# Altium footprint library Zmod.PcbLib: 229 footprints (part 11 of 15)
Each footprint in its own frame and in the unit in brackets; x right, y up, seen from the top. Pads: shape width x height; smd on the part's side, far side on the other; paste and mask are expansions set on the pad; w line width, h text height; cw(c..) or ccw(c..) is an arc to the next point about the centre after c.
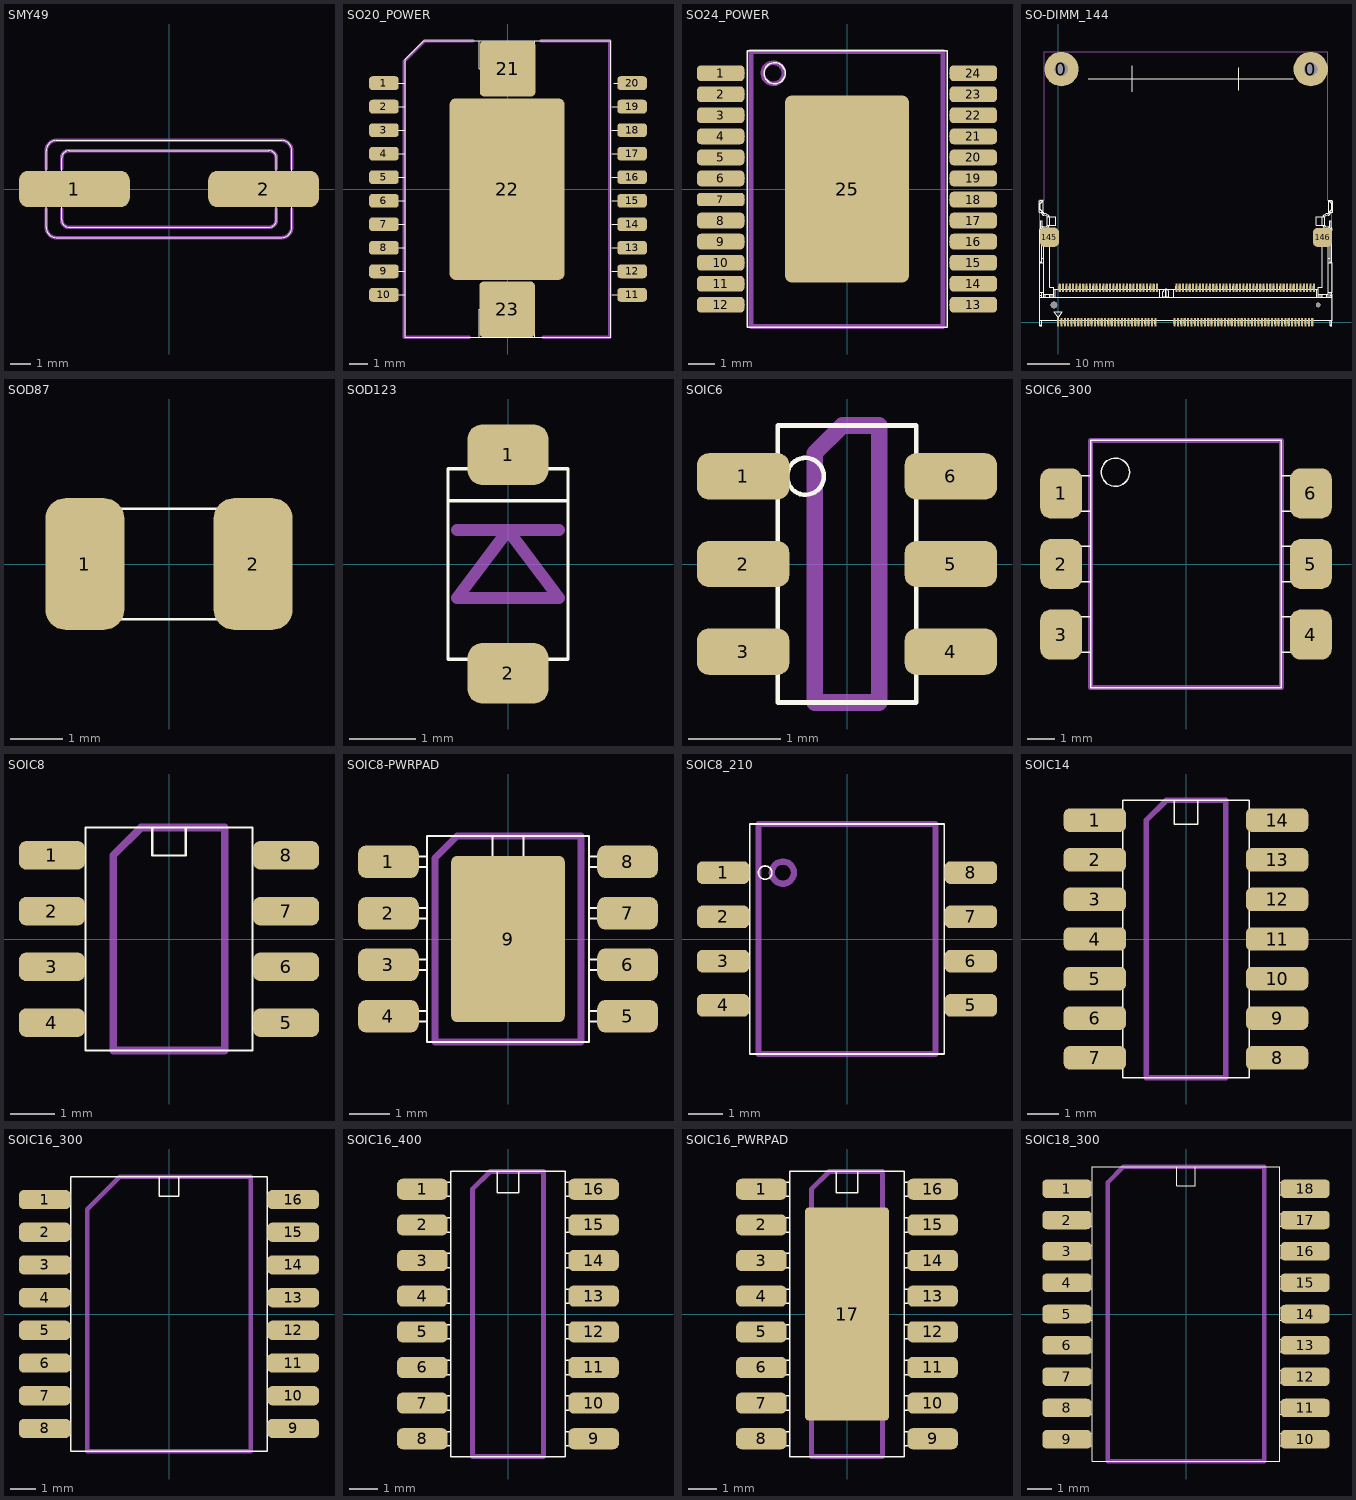
[diagram p10: the footprints below, top view; thin cyan lines are the x and y axes]

## SMY49 [mm]
height 5.08
pads (2):
  rrect50% 5.5x1.8 smd: 1(-4.699,0) 2(4.699,0)
Top Overlay:
  lines w0.05: -6.096,-0.508 -6.731,-0.508 -6.731,0.508 -6.096,0.508 ; 6.096,-0.508 6.731,-0.508 6.731,0.508 6.096,0.508 ; -6.096,-1.905 ccw(c-5.588,-1.905) -5.588,-2.413 5.588,-2.413 ccw(c5.588,-1.905) 6.096,-1.905 6.096,1.905 ccw(c5.588,1.905) 5.588,2.413 -5.588,2.413 ccw(c-5.588,1.905) -6.096,1.905 -6.096,-1.905 ; -5.334,-1.524 ccw(c-4.953,-1.524) -4.953,-1.905 4.953,-1.905 ccw(c4.953,-1.524) 5.334,-1.524 5.334,1.524 ccw(c4.953,1.524) 4.953,1.905 -4.953,1.905 ccw(c-4.953,1.524) -5.334,1.524 -5.334,-1.524
Mechanical 15:
  lines w0.18: -6.096,-1.016 -6.096,-1.905 ccw(c-5.588,-1.905) -5.588,-2.413 5.588,-2.413 ccw(c5.588,-1.905) 6.096,-1.905 6.096,-1.016 ; -6.096,1.016 -6.096,1.905 cw(c-5.588,1.905) -5.588,2.413 5.588,2.413 cw(c5.588,1.905) 6.096,1.905 6.096,1.016 ; -5.334,-1.016 -5.334,-1.524 ccw(c-4.953,-1.524) -4.953,-1.905 4.953,-1.905 ccw(c4.953,-1.524) 5.334,-1.524 5.334,-1.016 ; -5.334,1.016 -5.334,1.524 cw(c-4.953,1.524) -4.953,1.905 4.953,1.905 cw(c4.953,1.524) 5.334,1.524 5.334,1.016
  text ".Designator" at -6.223,2.667 h1.5

## SO20_POWER [mm] "ST Micro Jedec MO-166 Rev. 1"
height 3.6
pads (23):
  rrect50% 1.6x0.75 smd: 1(-6.7,5.715) 2(-6.7,4.445) 3(-6.7,3.175) 4(-6.7,1.905) 5(-6.7,0.635) 6(-6.7,-0.635) 7(-6.7,-1.905) 8(-6.7,-3.175) 9(-6.7,-4.445) 10(-6.7,-5.715) 11(6.7,-5.715) 12(6.7,-4.445) 13(6.7,-3.175) 14(6.7,-1.905) 15(6.7,-0.635) 16(6.7,0.635) 17(6.7,1.905) 18(6.7,3.175) 19(6.7,4.445) 20(6.7,5.715)
  rrect15% 3x3 smd: 21(-0.025,6.5) 23(-0.05,-6.5)
  rrect10% 6.2x9.8 smd: 22(-0.05,-0.01)
Top Overlay:
  lines w0.05: -6.7,1.905 -6.695,1.9 ; -6.6,-5.715 -5.6,-5.715 ; -6.6,-4.445 -5.6,-4.445 ; -6.6,-3.175 -5.6,-3.175 ; -6.6,-1.905 -5.6,-1.905 ; -6.6,-0.635 -5.6,-0.635 ; -6.6,0.635 -5.6,0.635 ; -6.6,3.175 -5.6,3.175 ; -6.6,4.445 -5.6,4.445 ; -6.6,5.715 -5.6,5.715 ; -6.345,1.9 -5.855,1.9 ; -5.955,1.9 -5.95,1.905 ; -5.85,1.905 -5.6,1.905 ; 5.6,-5.715 6.6,-5.715 ; 5.6,-4.445 6.6,-4.445 ; 5.6,-3.175 6.6,-3.175 ; 5.6,-1.905 6.6,-1.905 ; 5.6,-0.635 6.6,-0.635 ; 5.6,0.635 6.6,0.635 ; 5.6,1.905 6.6,1.905 ; 5.6,3.175 6.6,3.175 ; 5.6,4.445 6.6,4.445 ; 5.7,5.715 6.7,5.715 ; -1.55,-8 -1.55,-6.5 1.45,-6.5 1.45,-8 ; -1.55,-8 -5.55,-8 -5.55,7 -4.55,8 -1.55,8 ; -1.55,-8 1.45,-8 ; -1.55,8 -1.55,6.5 1.45,6.5 1.45,8 ; -1.55,8 1.45,8 ; 1.45,-8 5.55,-8 5.55,8 1.45,8
Top Solder:
  rectangle: -3.2,-5 3.1,5
  rectangle: -1.7,-8.1 1.6,-4.9
  rectangle: -1.6,4.9 1.6,8.1
Mechanical 15:
  lines w0.18: -2.1,-8 -5.6,-8 -5.6,-6.4 -5.6,6.9 -5.5,7 -4.5,8 -1.9,8 ; 1.8,8 5.5,8 5.5,-8 1.9,-8
  text ".Designator" at -6.8,-0.3 h1.5

## SO24_POWER [mm] "ST Micro, Rev. 1"
height 2.47
pads (25):
  rrect50% 1.8x0.6 smd mask+0.065: 1(-4.8,4.4) 2(-4.8,3.6) 3(-4.8,2.8) 4(-4.8,2) 5(-4.8,1.2) 6(-4.8,0.4) 8(-4.8,-1.2) 9(-4.8,-2) 10(-4.8,-2.8) 11(-4.8,-3.6) 12(-4.8,-4.4) 13(4.8,-4.4) 14(4.8,-3.6) 15(4.8,-2.8) 16(4.8,-2) 17(4.8,-1.2) 18(4.8,-0.4) 19(4.8,0.4) 20(4.8,1.2) 21(4.8,2) 22(4.8,2.8) 23(4.8,3.6) 24(4.8,4.4)
  rrect50% 1.8x0.51 smd mask+0.065: 7(-4.8,-0.4)
  rrect10% 4.7x7.1 smd mask+0.065: 25(0,0)
Top Overlay:
  circle w0.05: c-2.75,4.4 r0.4
  lines w0.05: -4.45,-4.4 -3.9,-4.4 ; -4.45,-3.6 -3.9,-3.6 ; -4.45,-2.8 -3.9,-2.8 ; -4.45,-2 -3.9,-2 ; -4.45,-1.2 -3.9,-1.2 ; -4.45,-0.4 -3.9,-0.4 ; -4.45,0.4 -3.9,0.4 ; -4.45,1.2 -3.9,1.2 ; -4.45,2 -3.9,2 ; -4.45,2.8 -3.9,2.8 ; -4.45,3.6 -3.9,3.6 ; -4.45,4.4 -3.9,4.4 ; 3.9,-4.4 4.45,-4.4 ; 3.9,-3.6 4.45,-3.6 ; 3.9,-2.8 4.45,-2.8 ; 3.9,-2 4.45,-2 ; 3.9,-1.2 4.45,-1.2 ; 3.9,-0.4 4.45,-0.4 ; 3.9,0.4 4.45,0.4 ; 3.9,1.2 4.45,1.2 ; 3.9,2 4.45,2 ; 3.9,2.8 4.45,2.8 ; 3.9,3.6 4.45,3.6 ; 3.9,4.4 4.45,4.4 ; -3.8,-5.25 3.8,-5.25 3.8,5.25 -3.8,5.25 -3.8,-5.25
Mechanical 15:
  circle w0.18: c-2.8,4.4 r0.4
  lines w0.18: -3.675,5.225 3.65,5.225 3.65,-5.225 -3.65,-5.225 -3.65,5.225
  text ".Designator" at -3.4,-0.425 h1.5

## SO-DIMM_144 [mm]
height 5.6
pads (150):
  round 1.6 hole 1.6: 0(-1,4.1)
  round 8.2 hole 3.2: 0(0.8,60.35) 0(60.25,60.35)
  round 1.1 hole 1.1: 0(62,4.1)
  rrect50% 0.5x2 smd: 1(0,0) 2(0.4,8.2) 3(0.8,0) 4(1.2,8.2) 5(1.6,0) 6(2,8.2) 7(2.4,0) 8(2.8,8.2) 9(3.2,0) 10(3.6,8.2) 11(4,0) 12(4.4,8.2) 13(4.8,0) 14(5.2,8.2) 15(5.6,0) 16(6,8.2) 17(6.4,0) 18(6.8,8.2) 19(7.2,0) 20(7.6,8.2) 21(8,0) 22(8.4,8.2) 23(8.8,0) 24(9.2,8.2) 25(9.6,0) 26(10,8.2) 27(10.4,0) 28(10.8,8.2) 29(11.2,0) 30(11.6,8.2) 31(12,0) 32(12.4,8.2) 33(12.8,0) 34(13.2,8.2) 35(13.6,0) 36(14,8.2) 37(14.4,0) 38(14.8,8.2) 39(15.2,0) 40(15.6,8.2) 41(16,0) 42(16.4,8.2) 43(16.8,0) 44(17.2,8.2) 45(17.6,0) 46(18,8.2) 47(18.4,0) 48(18.8,8.2) 49(19.2,0) 50(19.6,8.2) 51(20,0) 52(20.4,8.2) 53(20.8,0) 54(21.2,8.2) 55(21.6,0) 56(22,8.2) 57(22.4,0) 58(22.8,8.2) 59(23.2,0) 60(23.6,8.2) 61(27.8,0) 62(28.2,8.2) 63(28.6,0) 64(29,8.2) 65(29.4,0) 66(29.8,8.2) 67(30.2,0) 68(30.6,8.2) 69(31,0) 70(31.4,8.2) 71(31.8,0) 72(32.2,8.2) 73(32.6,0) 74(33,8.2) 75(33.4,0) 76(33.8,8.2) 77(34.2,0) 78(34.6,8.2) 79(35,0) 80(35.4,8.2) 81(35.8,0) 82(36.2,8.2) 83(36.6,0) 84(37,8.2) 85(37.4,0) 86(37.8,8.2) 87(38.2,0) 88(38.6,8.2) 89(39,0) 90(39.4,8.2) 91(39.8,0) 92(40.2,8.2) 93(40.6,0) 94(41,8.2) 95(41.4,0) 96(41.8,8.2) 97(42.2,0) 98(42.6,8.2) 99(43,0) 100(43.4,8.2) 101(43.8,0) 102(44.2,8.2) 103(44.6,0) 104(45,8.2) 105(45.4,0) 106(45.8,8.2) 107(46.2,0) 108(46.6,8.2) 109(47,0) 110(47.4,8.2) 111(47.8,0) 112(48.2,8.2) 113(48.6,0) 114(49,8.2) 115(49.4,0) 116(49.8,8.2) 117(50.2,0) 118(50.6,8.2) 119(51,0) 120(51.4,8.2) 121(51.8,0) 122(52.2,8.2) 123(52.6,0) 124(53,8.2) 125(53.4,0) 126(53.8,8.2) 127(54.2,0) 128(54.6,8.2) 129(55,0) 130(55.4,8.2) 131(55.8,0) 132(56.2,8.2) 133(56.6,0) 134(57,8.2) 135(57.4,0) 136(57.8,8.2) 137(58.2,0) 138(58.6,8.2) 139(59,0) 140(59.4,8.2) 141(59.8,0) 142(60.2,8.2) 143(60.6,0) 144(61,8.2)
  rrect50% 4.5x4.6 smd: 145(-2.05,20.25) 146(63.05,20.2)
Top Overlay:
  drawing of 3786 lines, arcs and shapes, not listed
Mechanical 15:
  lines w0.18: -0.4,0.4 -3.95,0.4 -3.95,-0.8 -4.35,-0.8 -4.35,29.15 -3.3,29.15 -3.3,64.5 -1,64.5 64.3,64.5 64.3,55.9 64.3,29.05 65.3,29.05 65.3,-0.8 64.9,-0.8 64.9,0.4 61.05,0.4
  text ".Designator" at 22.05,32.8 h1.5

## SOD87 [mm]
height 2.1
pads (2):
  rrect50% 1.5x2.5 smd: 1(-1.6,0) 2(1.6,0)
Top Overlay:
  lines w0.05: -1.4,-1.05 -1.4,1.05 ; -1.85,-1.05 1.85,-1.05 1.85,1.05 -1.85,1.05 -1.85,-1.05
  text ".Designator" at -1.4,-0.7 h1.5

## SOD123 [mm] "SOD123"
height 1.2
pads (2):
  rrect50% 1.22x0.91 smd: 1(0,1.64) 2(0,-1.64)
Top Overlay:
  lines w0.05: -0.878,0.95 0.9,0.95 ; -0.35,-1.43 -0.35,-1.95 0.35,-1.95 0.35,-1.43 ; -0.35,1.43 -0.35,1.95 0.35,1.95 0.35,1.43 ; -0.9,-1.43 -0.9,1.43 0.9,1.43 0.9,-1.43 -0.9,-1.43
Mechanical 15:
  lines w0.18: -0.762,0.508 0.762,0.508 ; -0.762,-0.508 0,0.508 0.762,-0.508 -0.762,-0.508
  text ".Designator" at 0.65,-2.46 h1.5

## SOIC6 [mm]
height 1.5
pads (6):
  rrect50% 1x0.5 smd paste+0: 1(-1.125,0.95) 2(-1.125,0) 3(-1.125,-0.95) 4(1.125,-0.95) 5(1.125,0) 6(1.125,0.95)
Top Overlay:
  circle w0.05: c-0.45,0.95 r0.2
  lines w0.05: -0.76,-1.1 -1.4,-1.1 -1.4,-0.8 -0.75,-0.8 ; -0.75,-0.15 -1.4,-0.15 -1.4,0.15 -0.75,0.15 ; -0.75,0.8 -1.4,0.8 -1.4,1.1 -0.75,1.1 ; 0.75,-1.1 1.4,-1.1 1.4,-0.8 0.75,-0.8 ; 0.75,-0.15 1.4,-0.15 1.4,0.15 0.75,0.15 ; 0.75,0.8 1.4,0.8 1.4,1.1 0.75,1.1 ; -0.75,-1.5 0.75,-1.5 0.75,1.5 -0.75,1.5 -0.75,-1.5
Mechanical 15:
  lines w0.18: -0.35,-1.5 0.35,-1.5 0.35,1.5 -0.05,1.5 -0.35,1.2 -0.35,-1.5
  text ".Designator" at 0,-1.627 h1.5

## SOIC6_300 [mm]
height 5
pads (6):
  rrect50% 1.5x1.8 smd paste+0: 1(-4.496,2.54) 2(-4.496,0) 3(-4.496,-2.54) 4(4.496,-2.54) 5(4.496,0) 6(4.496,2.54)
Top Overlay:
  circle w0.05: c-2.54,3.302 r0.508
  lines w0.05: -3.429,-3.175 -3.81,-3.175 -4.318,-2.794 -4.953,-2.794 -4.953,-2.286 -4.318,-2.286 -3.81,-1.905 -3.429,-1.905 ; -3.429,-0.635 -3.81,-0.635 -4.318,-0.254 -4.953,-0.254 -4.953,0.254 -4.318,0.254 -3.81,0.635 -3.429,0.635 ; -3.429,1.905 -3.81,1.905 -4.318,2.286 -4.953,2.286 -4.953,2.794 -4.318,2.794 -3.81,3.175 -3.429,3.175 ; 3.429,-3.175 3.81,-3.175 4.318,-2.794 4.953,-2.794 4.953,-2.286 4.318,-2.286 3.81,-1.905 3.429,-1.905 ; 3.429,-0.635 3.81,-0.635 4.318,-0.254 4.953,-0.254 4.953,0.254 4.318,0.254 3.81,0.635 3.429,0.635 ; 3.429,1.905 3.81,1.905 4.318,2.286 4.953,2.286 4.953,2.794 4.318,2.794 3.81,3.175 3.429,3.175 ; -3.429,-4.445 3.429,-4.445 3.429,4.445 -3.429,4.445 -3.429,-4.445
Mechanical 15:
  lines w0.18: -3.429,-4.445 3.429,-4.445 3.429,4.445 -3.429,4.445 -3.429,-4.445
  text ".Designator" at -1.27,-3.81 h1.5

## SOIC8 [mm]
height 1.1
pads (8):
  rrect50% 1.5x0.65 smd: 1(-2.667,1.905) 2(-2.667,0.635) 3(-2.667,-0.635) 4(-2.667,-1.905) 5(2.667,-1.905) 6(2.667,-0.635) 7(2.667,0.635) 8(2.667,1.905)
Top Overlay:
  lines w0.05: -1.905,-2.032 -2.667,-2.032 -2.667,-1.778 -1.905,-1.778 ; -1.905,-0.762 -2.667,-0.762 -2.667,-0.508 -1.905,-0.508 ; -1.905,0.508 -2.667,0.508 -2.667,0.762 -1.905,0.762 ; -1.905,1.778 -2.667,1.778 -2.667,2.032 -1.905,2.032 ; -0.381,2.54 -0.381,1.905 0.381,1.905 0.381,2.54 ; 1.905,-2.032 2.667,-2.032 2.667,-1.778 1.905,-1.778 ; 1.905,-0.762 2.667,-0.762 2.667,-0.508 1.905,-0.508 ; 1.905,0.508 2.667,0.508 2.667,0.762 1.905,0.762 ; 1.905,1.778 2.667,1.778 2.667,2.032 1.905,2.032 ; -1.905,-2.54 1.905,-2.54 1.905,2.54 -1.27,2.54 -1.905,2.54 -1.905,-2.54
Mechanical 15:
  lines w0.18: -1.27,-2.54 1.27,-2.54 1.27,2.54 -0.635,2.54 -1.27,1.905 -1.27,-2.54
  text ".Designator" at 0.2,-2.4 h1.5

## SOIC8-PWRPAD [mm] "SOIC WITH POWER PAD"
height 1.1
pads (9):
  rrect50% 1.5x0.8 smd: 1(-2.95,1.905) 2(-2.95,0.635) 3(-2.95,-0.635) 4(-2.95,-1.905) 5(2.95,-1.905) 6(2.95,-0.635) 7(2.95,0.635) 8(2.95,1.905)
  rrect10% 2.8x4.1 smd: 9(0,0)
Top Overlay:
  lines w0.05: -2.013,-2.032 -3,-2.032 -3,-1.778 -2.003,-1.778 ; -2.005,2.032 -2,2.037 ; -2.002,1.778 -2,1.776 ; -2,-0.762 -3,-0.762 -3,-0.508 -2,-0.508 ; -2,0.508 -3,0.508 -3,0.762 -2,0.762 ; -2,1.778 -3,1.778 -3,2.032 -2,2.032 ; -0.381,2.54 -0.381,1.905 0.381,1.905 0.381,2.54 ; 2,-2.032 3,-2.032 3,-1.778 2,-1.778 ; 2,-0.762 3,-0.762 3,-0.508 2,-0.508 ; 2,0.508 3,0.508 3,0.762 2,0.762 ; 2,1.774 2.004,1.778 3,1.778 3,2.032 2,2.032 ; -2,-2.54 2,-2.54 2,2.54 -1.27,2.54 -2,2.54 -2,-2.54
Mechanical 15:
  lines w0.18: -1.8,-2.54 1.8,-2.54 1.8,2.54 -1.26,2.54 -1.8,2 -1.8,-2.54
  text ".Designator" at 0.6,-2.2 h1.5

## SOIC8_210 [mm]
height 1.905
pads (8):
  rrect50% 1.5x0.65 smd paste+0: 1(-3.556,1.905) 2(-3.556,0.635) 3(-3.556,-0.635) 4(-3.556,-1.905) 5(3.556,-1.905) 6(3.556,-0.635) 7(3.556,0.635) 8(3.556,1.905)
Top Overlay:
  lines w0.05: -2.794,-2.032 -3.81,-2.032 -3.81,-1.778 -2.794,-1.778 ; -2.794,-0.762 -3.81,-0.762 -3.81,-0.508 -2.794,-0.508 ; -2.794,0.508 -3.81,0.508 -3.81,0.762 -2.794,0.762 ; -2.794,1.778 -3.81,1.778 -3.81,2.032 -2.794,2.032 ; 2.794,-2.032 3.81,-2.032 3.81,-1.778 2.794,-1.778 ; 2.794,-0.762 3.81,-0.762 3.81,-0.508 2.794,-0.508 ; 2.794,0.508 3.81,0.508 3.81,0.762 2.794,0.762 ; 2.794,1.778 3.81,1.778 3.81,2.032 2.794,2.032 ; -2.794,-3.302 2.794,-3.302 2.794,3.302 -2.794,3.302 -2.794,-3.302 ; -2.54,1.905 ccw(c-2.349,1.905) -2.159,1.905 ccw(c-2.349,1.905) -2.54,1.905
Mechanical 15:
  lines w0.18: -2.54,-3.302 2.54,-3.302 2.54,3.302 -2.54,3.302 -2.54,-3.302 ; -2.159,1.905 ccw(c-1.841,1.905) -1.524,1.905 ccw(c-1.841,1.905) -2.159,1.905
  text ".Designator" at -0.889,-3.048 h1.5

## SOIC14 [mm]
height 1.905
pads (14):
  rrect50% 2x0.75 smd paste+0: 1(-2.921,3.81) 2(-2.921,2.54) 3(-2.921,1.27) 4(-2.921,0) 5(-2.921,-1.27) 6(-2.921,-2.54) 7(-2.921,-3.81) 8(2.921,-3.81) 9(2.921,-2.54) 10(2.921,-1.27) 11(2.921,0) 12(2.921,1.27) 13(2.921,2.54) 14(2.921,3.81)
Top Overlay:
  lines w0.05: -2.032,-4.064 -3.175,-4.064 -3.175,-3.556 -2.032,-3.556 ; -2.032,-2.794 -3.175,-2.794 -3.175,-2.286 -2.032,-2.286 ; -2.032,-1.524 -3.175,-1.524 -3.175,-1.016 -2.032,-1.016 ; -2.032,-0.254 -3.175,-0.254 -3.175,0.254 -2.032,0.254 ; -2.032,1.016 -3.175,1.016 -3.175,1.524 -2.032,1.524 ; -2.032,2.286 -3.175,2.286 -3.175,2.794 -2.032,2.794 ; -2.032,3.556 -3.175,3.556 -3.175,4.064 -2.032,4.064 ; -0.381,4.445 -0.381,3.683 0.381,3.683 0.381,4.445 ; 2.032,-4.064 3.175,-4.064 3.175,-3.556 2.032,-3.556 ; 2.032,-2.794 3.175,-2.794 3.175,-2.286 2.032,-2.286 ; 2.032,-1.524 3.175,-1.524 3.175,-1.016 2.032,-1.016 ; 2.032,-0.254 3.175,-0.254 3.175,0.254 2.032,0.254 ; 2.032,1.016 3.175,1.016 3.175,1.524 2.032,1.524 ; 2.032,2.286 3.175,2.286 3.175,2.794 2.032,2.794 ; 2.032,3.556 3.175,3.556 3.175,4.064 2.032,4.064 ; -2.032,-4.445 2.032,-4.445 2.032,4.445 -2.032,4.445 -2.032,-4.445
Mechanical 15:
  lines w0.18: -1.27,-4.445 -1.27,3.81 -0.635,4.445 1.27,4.445 1.27,-4.445 -1.27,-4.445
  text ".Designator" at -0.762,-4.064 h1.5

## SOIC16_300 [mm]
height 1.905
pads (16):
  rrect50% 2x0.75 smd paste+0: 1(-4.826,4.445) 2(-4.826,3.175) 3(-4.826,1.905) 4(-4.826,0.635) 5(-4.826,-0.635) 6(-4.826,-1.905) 7(-4.826,-3.175) 8(-4.826,-4.445) 9(4.826,-4.445) 10(4.826,-3.175) 11(4.826,-1.905) 12(4.826,-0.635) 13(4.826,0.635) 14(4.826,1.905) 15(4.826,3.175) 16(4.826,4.445)
Top Overlay:
  lines w0.05: -3.81,-4.699 -5.334,-4.699 -5.334,-4.191 -3.81,-4.191 ; -3.81,-3.429 -5.334,-3.429 -5.334,-2.921 -3.81,-2.921 ; -3.81,-2.159 -5.334,-2.159 -5.334,-1.651 -3.81,-1.651 ; -3.81,-0.889 -5.334,-0.889 -5.334,-0.381 -3.81,-0.381 ; -3.81,0.381 -5.334,0.381 -5.334,0.889 -3.81,0.889 ; -3.81,1.651 -5.334,1.651 -5.334,2.159 -3.81,2.159 ; -3.81,2.921 -5.334,2.921 -5.334,3.429 -3.81,3.429 ; -3.81,4.191 -5.334,4.191 -5.334,4.699 -3.81,4.699 ; -0.381,5.334 -0.381,4.572 0.381,4.572 0.381,5.334 ; 3.81,-4.699 5.334,-4.699 5.334,-4.191 3.81,-4.191 ; 3.81,-3.429 5.334,-3.429 5.334,-2.921 3.81,-2.921 ; 3.81,-2.159 5.334,-2.159 5.334,-1.651 3.81,-1.651 ; 3.81,-0.889 5.334,-0.889 5.334,-0.381 3.81,-0.381 ; 3.81,0.381 5.334,0.381 5.334,0.889 3.81,0.889 ; 3.81,1.651 5.334,1.651 5.334,2.159 3.81,2.159 ; 3.81,2.921 5.334,2.921 5.334,3.429 3.81,3.429 ; 3.81,4.191 5.334,4.191 5.334,4.699 3.81,4.699 ; -3.81,-5.334 3.81,-5.334 3.81,5.334 -3.81,5.334 -3.81,-5.334
Mechanical 15:
  lines w0.18: -3.175,-5.334 3.175,-5.334 3.175,5.334 -1.905,5.334 -3.175,4.064 -3.175,-5.334
  text ".Designator" at -1.397,-5.207 h1.5

## SOIC16_400 [mm] "Texas 16 pin, 1.27mm pitch, SOIC, 4.00 wide, Rev. 1"
height 1.75
pads (16):
  rrect50% 1.8x0.75 smd paste+0: 1(-3.048,4.445) 2(-3.048,3.175) 3(-3.048,1.905) 4(-3.048,0.635) 5(-3.048,-0.635) 6(-3.048,-1.905) 7(-3.048,-3.175) 8(-3.048,-4.445) 9(3.048,-4.445) 10(3.048,-3.175) 11(3.048,-1.905) 12(3.048,-0.635) 13(3.048,0.635) 14(3.048,1.905) 15(3.048,3.175) 16(3.048,4.445)
Top Overlay:
  lines w0.05: -2.032,-4.699 -3.175,-4.699 -3.175,-4.191 -2.032,-4.191 ; -2.032,-3.429 -3.175,-3.429 -3.175,-2.921 -2.032,-2.921 ; -2.032,-2.159 -3.175,-2.159 -3.175,-1.651 -2.032,-1.651 ; -2.032,-0.889 -3.175,-0.889 -3.175,-0.381 -2.032,-0.381 ; -2.032,0.381 -3.175,0.381 -3.175,0.889 -2.032,0.889 ; -2.032,1.651 -3.175,1.651 -3.175,2.159 -2.032,2.159 ; -2.032,2.921 -3.175,2.921 -3.175,3.429 -2.032,3.429 ; -2.032,4.191 -3.175,4.191 -3.175,4.699 -2.032,4.699 ; -0.381,5.08 -0.381,4.318 0.381,4.318 0.381,5.08 ; 2.032,-4.699 3.175,-4.699 3.175,-4.191 2.032,-4.191 ; 2.032,-3.429 3.175,-3.429 3.175,-2.921 2.032,-2.921 ; 2.032,-2.159 3.175,-2.159 3.175,-1.651 2.032,-1.651 ; 2.032,-0.889 3.175,-0.889 3.175,-0.381 2.032,-0.381 ; 2.032,0.381 3.175,0.381 3.175,0.889 2.032,0.889 ; 2.032,1.651 3.175,1.651 3.175,2.159 2.032,2.159 ; 2.032,2.921 3.175,2.921 3.175,3.429 2.032,3.429 ; 2.032,4.191 3.175,4.191 3.175,4.699 2.032,4.699 ; -2.032,-5.08 -2.032,5.08 2.032,5.08 2.032,-5.08 -2.032,-5.08
  text ".Designator" at 0.467,-5.801 h1.5
Mechanical 15:
  lines w0.18: -1.27,-5.08 -1.27,4.445 -0.635,5.08 1.27,5.08 1.27,-5.08 -1.27,-5.08

## SOIC16_PWRPAD [mm]
height 1.905
pads (17):
  rrect50% 1.8x0.75 smd paste+0: 1(-3.048,4.445) 2(-3.048,3.175) 3(-3.048,1.905) 4(-3.048,0.635) 5(-3.048,-0.635) 6(-3.048,-1.905) 7(-3.048,-3.175) 8(-3.048,-4.445) 9(3.048,-4.445) 10(3.048,-3.175) 11(3.048,-1.905) 12(3.048,-0.635) 13(3.048,0.635) 14(3.048,1.905) 15(3.048,3.175) 16(3.048,4.445)
  rrect10% 3x7.6 smd paste+0: 17(0,0)
Top Overlay:
  lines w0.05: -2.032,-4.699 -3.175,-4.699 -3.175,-4.191 -2.032,-4.191 ; -2.032,-3.429 -3.175,-3.429 -3.175,-2.921 -2.032,-2.921 ; -2.032,-2.159 -3.175,-2.159 -3.175,-1.651 -2.032,-1.651 ; -2.032,-0.889 -3.175,-0.889 -3.175,-0.381 -2.032,-0.381 ; -2.032,0.381 -3.175,0.381 -3.175,0.889 -2.032,0.889 ; -2.032,1.651 -3.175,1.651 -3.175,2.159 -2.032,2.159 ; -2.032,2.921 -3.175,2.921 -3.175,3.429 -2.032,3.429 ; -2.032,4.191 -3.175,4.191 -3.175,4.699 -2.032,4.699 ; -0.381,5.08 -0.381,4.318 0.381,4.318 0.381,5.08 ; 2.032,-4.699 3.175,-4.699 3.175,-4.191 2.032,-4.191 ; 2.032,-3.429 3.175,-3.429 3.175,-2.921 2.032,-2.921 ; 2.032,-2.159 3.175,-2.159 3.175,-1.651 2.032,-1.651 ; 2.032,-0.889 3.175,-0.889 3.175,-0.381 2.032,-0.381 ; 2.032,0.381 3.175,0.381 3.175,0.889 2.032,0.889 ; 2.032,1.651 3.175,1.651 3.175,2.159 2.032,2.159 ; 2.032,2.921 3.175,2.921 3.175,3.429 2.032,3.429 ; 2.032,4.191 3.175,4.191 3.175,4.699 2.032,4.699 ; -2.032,-5.08 -2.032,5.08 2.032,5.08 2.032,-5.08 -2.032,-5.08
Mechanical 15:
  lines w0.18: -1.27,-5.08 -1.27,4.445 -0.635,5.08 1.27,5.08 1.27,-5.08 -1.27,-5.08
  text ".Designator" at -0.508,-4.826 h1.5

## SOIC18_300 [mm]
height 1.905
pads (18):
  rrect50% 2x0.75 smd paste+0: 1(-4.826,5.08) 2(-4.826,3.81) 3(-4.826,2.54) 4(-4.826,1.27) 5(-4.826,0) 6(-4.826,-1.27) 7(-4.826,-2.54) 8(-4.826,-3.81) 9(-4.826,-5.08) 10(4.826,-5.08) 11(4.826,-3.81) 12(4.826,-2.54) 13(4.826,-1.27) 14(4.826,0) 15(4.826,1.27) 16(4.826,2.54) 17(4.826,3.81) 18(4.826,5.08)
Top Overlay:
  lines w0.05: -3.81,-5.334 -5.334,-5.334 -5.334,-4.826 -3.81,-4.826 ; -3.81,-4.064 -5.334,-4.064 -5.334,-3.556 -3.81,-3.556 ; -3.81,-2.794 -5.334,-2.794 -5.334,-2.286 -3.81,-2.286 ; -3.81,-1.524 -5.334,-1.524 -5.334,-1.016 -3.81,-1.016 ; -3.81,-0.254 -5.334,-0.254 -5.334,0.254 -3.81,0.254 ; -3.81,1.016 -5.334,1.016 -5.334,1.524 -3.81,1.524 ; -3.81,2.286 -5.334,2.286 -5.334,2.794 -3.81,2.794 ; -3.81,3.556 -5.334,3.556 -5.334,4.064 -3.81,4.064 ; -3.81,4.826 -5.334,4.826 -5.334,5.334 -3.81,5.334 ; -0.381,5.969 -0.381,5.207 0.381,5.207 0.381,5.969 ; 3.81,-5.334 5.334,-5.334 5.334,-4.826 3.81,-4.826 ; 3.81,-4.064 5.334,-4.064 5.334,-3.556 3.81,-3.556 ; 3.81,-2.794 5.334,-2.794 5.334,-2.286 3.81,-2.286 ; 3.81,-1.524 5.334,-1.524 5.334,-1.016 3.81,-1.016 ; 3.81,-0.254 5.334,-0.254 5.334,0.254 3.81,0.254 ; 3.81,1.016 5.334,1.016 5.334,1.524 3.81,1.524 ; 3.81,2.286 5.334,2.286 5.334,2.794 3.81,2.794 ; 3.81,3.556 5.334,3.556 5.334,4.064 3.81,4.064 ; 3.81,4.826 5.334,4.826 5.334,5.334 3.81,5.334 ; -3.81,-5.969 3.81,-5.969 3.81,5.969 -3.81,5.969 -3.81,-5.969
Mechanical 15:
  lines w0.18: -3.175,-5.969 3.175,-5.969 3.175,5.969 -2.54,5.969 -3.175,5.334 -3.175,-5.969
  text ".Designator" at -1.143,-5.461 h1.5